# Altium footprint library Reflow3D1411sep.PcbLib: 657 footprints (part 33 of 42)
Each footprint in its own frame and in the unit in brackets; x right, y up, seen from the top. Pads: shape width x height; smd on the part's side, far side on the other; paste and mask are expansions set on the pad; w line width, h text height; cw(c..) or ccw(c..) is an arc to the next point about the centre after c.
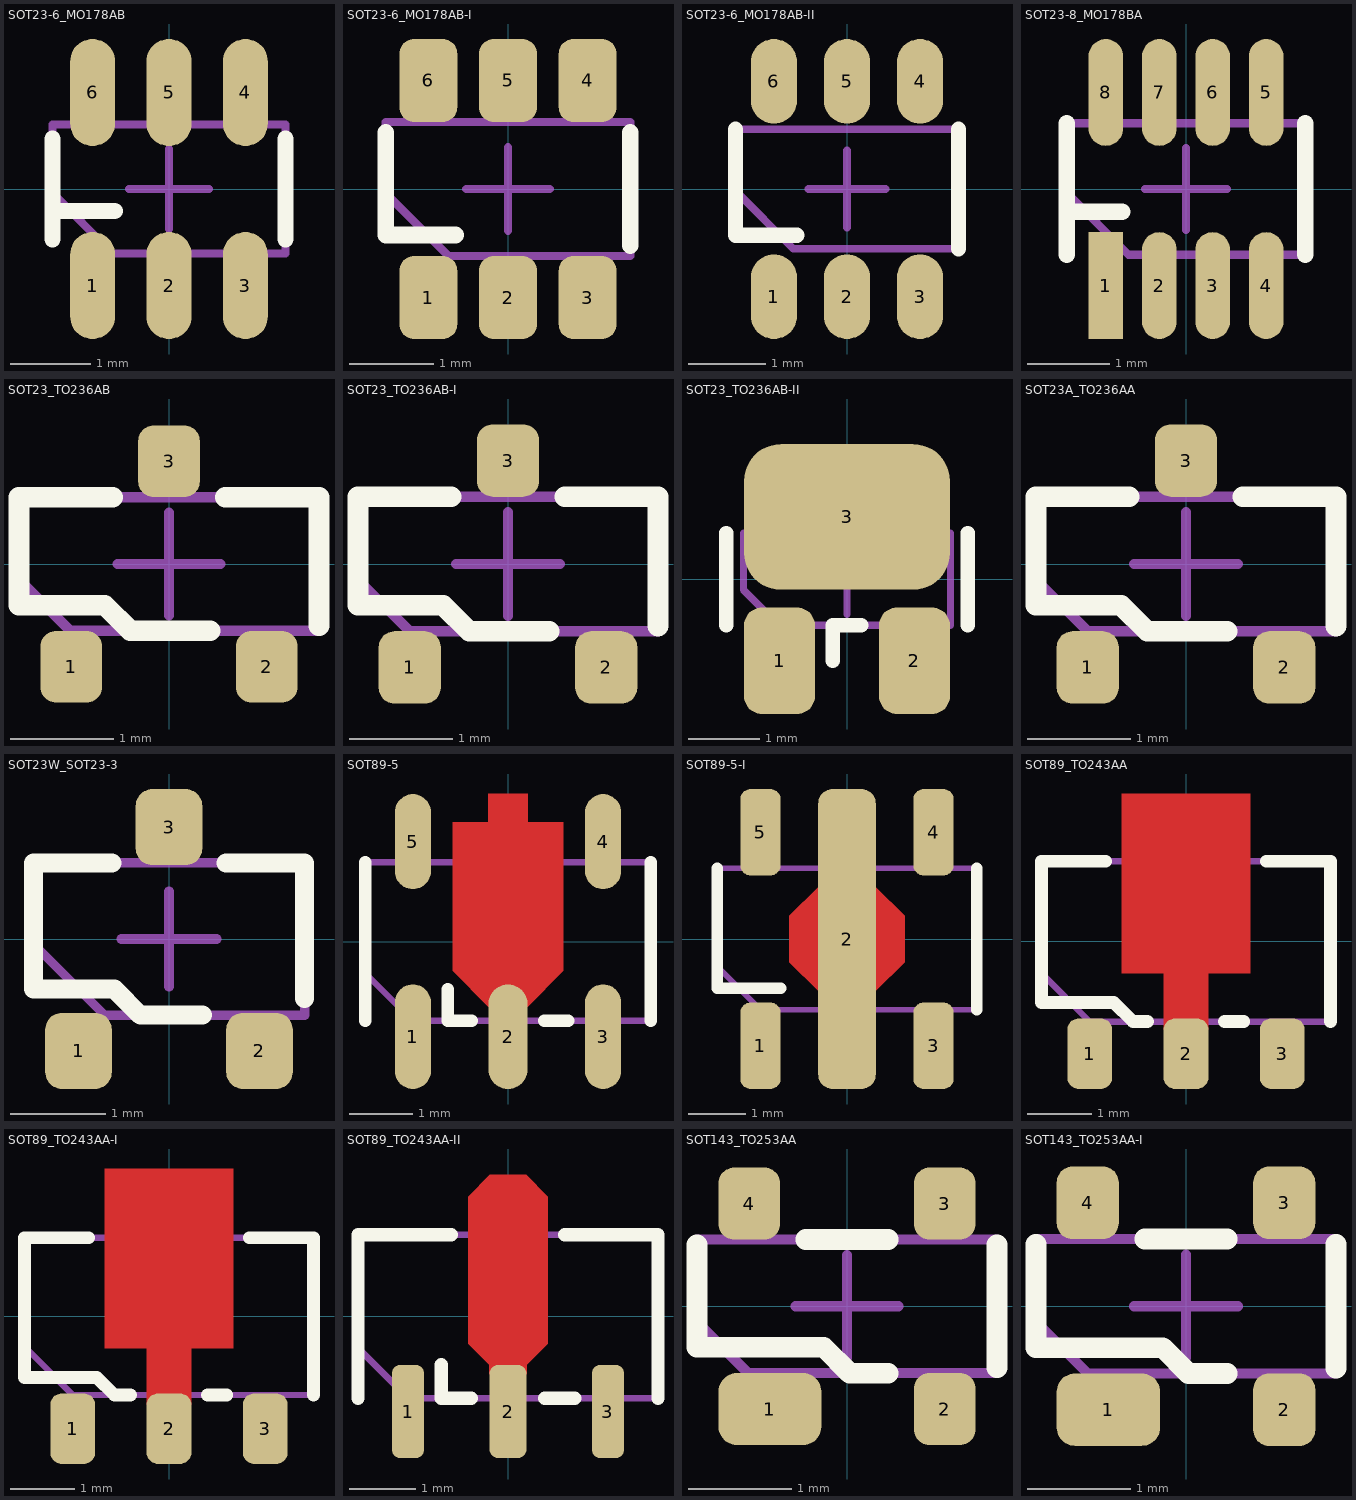
[diagram p32: the footprints below, top view; thin cyan lines are the x and y axes]

## SOT23-6_MO178AB [mm] "www.maxim-ic.com, 21-0058.PDF, 90-0175.PDF; www.jedec.org, Mo-178c.PDF"
height 1.25
pads (6):
  oval 0.56x1.33 smd mask+0.075: 1(-0.95,-1.2) 2(0,-1.2) 3(0.95,-1.2) 4(0.95,1.2) 5(0,1.2) 6(-0.95,1.2)
Top Overlay:
  lines w0.2: -1.45,-0.625 -1.45,0.625 ; -1.45,-0.275 -0.675,-0.275 ; 1.45,-0.625 1.45,0.625
Mechanical 13:
  lines w0.1: -1.45,-0.05 -0.7,-0.8 1.45,-0.8 1.45,0.8 -1.45,0.8 -1.45,-0.05
Mechanical 15:
  lines w0.1: -0.5,0 0.5,0 ; 0,-0.5 0,0.5
3D body: height 1.45, standoff 0, extent -1.5,-0.875 1.5,0.875

## SOT23-6_MO178AB-I [mm] "www.national.com, mf06a.pdf"
height 1.1
pads (6):
  rrect50% 0.69x0.99 smd mask+0.05: 1(-0.95,-1.295) 2(0,-1.295) 3(0.95,-1.295) 4(0.95,1.295) 5(0,1.295) 6(-0.95,1.295)
Top Overlay:
  lines w0.2: -1.46,0.675 -1.46,-0.55 -0.625,-0.55 ; 1.46,-0.675 1.46,0.675
Mechanical 13:
  lines w0.1: -1.46,-0.05 -0.71,-0.8 1.46,-0.8 1.46,0.8 -1.46,0.8 -1.46,-0.05
Mechanical 15:
  lines w0.1: -0.5,0 0.5,0 ; 0,-0.5 0,0.5
3D body: height 1.22, standoff 0, extent -1.495,-0.835 1.495,0.835

## SOT23-6_MO178AB-II [mm] "www.microchip.com, en012702.pdf"
height 1.18
pads (6):
  oval 0.6x1.1 smd mask+0.075: 1(-0.95,-1.4) 2(0,-1.4) 3(0.95,-1.4) 4(0.95,1.4) 5(0,1.4) 6(-0.95,1.4)
Top Overlay:
  lines w0.2: -1.45,0.775 -1.45,-0.6 -0.65,-0.6 ; 1.45,-0.775 1.45,0.775
Mechanical 13:
  lines w0.1: -1.45,-0.025 -0.7,-0.775 1.45,-0.775 1.45,0.775 -1.45,0.775 -1.45,-0.025
Mechanical 15:
  lines w0.1: -0.5,0 0.5,0 ; 0,-0.5 0,0.5
3D body: height 1.45, standoff 0, extent -1.55,-0.9 1.55,0.9

## SOT23-8_MO178BA [mm] "www.maxim-ic.com, 21-0078.PDF, 90-0176.PDF; www.jedec.org, Mo-178c.PDF"
height 1.25
pads (8):
  rect 0.42x1.3 smd mask+0.05: 1(-0.975,-1.175)
  oval 0.42x1.3 smd mask+0.05: 2(-0.325,-1.175) 3(0.325,-1.175) 4(0.975,-1.175) 5(0.975,1.175) 6(0.325,1.175) 7(-0.325,1.175) 8(-0.975,1.175)
Top Overlay:
  lines w0.2: -1.45,-0.8 -1.45,0.8 ; -1.45,-0.275 -0.775,-0.275 ; 1.45,-0.8 1.45,0.8
Mechanical 13:
  lines w0.1: -1.45,-0.05 -0.7,-0.8 1.45,-0.8 1.45,0.8 -1.45,0.8 -1.45,-0.05
Mechanical 15:
  lines w0.1: -0.5,0 0.5,0 ; 0,-0.5 0,0.5
3D body: height 1.45, standoff 0, extent -1.5,-0.875 1.5,0.875

## SOT23_TO236AB [mm] "www.nxp.com, SOT023_fr.pdf; www.maxim-ic.com, 21-0051.PDF; www.jedec.org, to-236h.pdf"
height 1
pads (3):
  rrect50% 0.6x0.7 smd mask+0.075: 1(-0.95,-1) 2(0.95,-1) 3(0,1)
Top Overlay:
  lines w0.2: -0.55,0.65 -1.46,0.65 -1.46,-0.4 -0.625,-0.4 -0.375,-0.65 0.4,-0.65 ; 0.55,0.65 1.46,0.65 1.46,-0.6
Mechanical 13:
  lines w0.1: -1.46,-0.15 -1.46,0.65 1.46,0.65 1.46,-0.65 -0.96,-0.65 -1.46,-0.15
Mechanical 15:
  lines w0.1: -0.5,0 0.5,0 ; 0,-0.5 0,0.5
3D body: height 1.12, standoff 0, extent -1.52,-0.7 1.52,0.7

## SOT23_TO236AB-I [mm] "www.nxp.com, sot023_po.pdf, SOT023_fr.pdf"
height 1
pads (3):
  rrect50% 0.6x0.7 smd mask+0.075: 1(-0.95,-1) 2(0.95,-1) 3(0,1)
Top Overlay:
  lines w0.2: -0.55,0.65 -1.45,0.65 -1.45,-0.4 -0.625,-0.4 -0.375,-0.65 0.4,-0.65 ; 0.55,0.65 1.45,0.65 1.45,-0.6
Mechanical 13:
  lines w0.1: -1.45,-0.15 -0.95,-0.65 1.45,-0.65 1.45,0.65 -1.45,0.65 -1.45,-0.15
Mechanical 15:
  lines w0.1: -0.5,0 0.5,0 ; 0,-0.5 0,0.5
3D body: height 1.1, standoff 0, extent -1.5,-0.7 1.5,0.7

## SOT23_TO236AB-II [mm] "www.vishay.com, 70739.pdf; www.maxim-ic.com, 21-0051.PDF; www.jedec.org, to-236h.pdf"
height 1
pads (3):
  rrect50% 1x1.5 smd mask+0.075: 1(-0.95,-1.15) 2(0.95,-1.15)
  rrect50% 2.9x2.05 smd mask+0.075: 3(0,0.875)
Top Overlay:
  lines w0.2: -1.7,-0.65 -1.7,0.65 ; -0.2,-1.15 -0.2,-0.65 0.2,-0.65 ; 1.7,-0.65 1.7,0.65
Mechanical 13:
  lines w0.1: -1.46,-0.15 -0.96,-0.65 1.46,-0.65 1.46,0.65 -1.46,0.65 -1.46,-0.15
Mechanical 15:
  lines w0.1: -0.5,0 0.5,0 ; 0,-0.5 0,0.5
3D body: height 1.12, standoff 0, extent -1.52,-0.7 1.52,0.7

## SOT23A_TO236AA [mm] "www.nxp.com, SOT023_fr.pdf; www.aosmd.com, AOZ8212CI-05.pdf; www.jedec.org, to-236h.pdf"
height 0.96
pads (3):
  rrect50% 0.6x0.7 smd mask+0.075: 1(-0.95,-1) 2(0.95,-1) 3(0,1)
Top Overlay:
  lines w0.2: -0.55,0.65 -1.45,0.65 -1.45,-0.4 -0.625,-0.4 -0.375,-0.65 0.4,-0.65 ; 0.55,0.65 1.45,0.65 1.45,-0.6
Mechanical 13:
  lines w0.1: -1.45,-0.15 -0.95,-0.65 1.45,-0.65 1.45,0.65 -1.45,0.65 -1.45,-0.15
Mechanical 15:
  lines w0.1: -0.5,0 0.5,0 ; 0,-0.5 0,0.5
3D body: height 1.17, standoff 0, extent -1.52,-0.7 1.52,0.7

## SOT23W_SOT23-3 [mm] "www.nxp.com, SOT023-3.pdf, SOT346_fr.pdf"
height 1.2
pads (3):
  rrect50% 0.7x0.8 smd mask+0.075: 1(-0.95,-1.175) 2(0.95,-1.175) 3(0,1.175)
Top Overlay:
  lines w0.2: -0.6,0.8 -1.425,0.8 -1.425,-0.525 -0.575,-0.525 -0.3,-0.8 0.35,-0.8 ; 0.6,0.8 1.425,0.8 1.425,-0.625
Mechanical 13:
  lines w0.1: -1.425,-0.05 -0.675,-0.8 1.425,-0.8 1.425,0.8 -1.425,0.8 -1.425,-0.05
Mechanical 15:
  lines w0.1: -0.5,0 0.5,0 ; 0,-0.5 0,0.5
3D body: height 1.35, standoff 0, extent -1.5,-0.85 1.5,0.85

## SOT89-5 [mm] "www.onsemi.com, 528AB.PDF"
height 1.5
pads (5):
  oval 0.57x1.65 smd mask+0.075: 1(-1.5,-1.5) 3(1.5,-1.5)
  oval 0.62x1.65 smd paste-25.4 mask+0.075: 2(0,-1.5)
  oval 0.57x1.5 smd mask+0.075: 4(1.5,1.575) 5(-1.5,1.575)
Top Layer:
  region: -0.875,-0.46 -0.31,-1.025 0.31,-1.025 0.875,-0.46 0.875,1.88 0.31,1.88 0.31,2.33 -0.31,2.33 -0.31,1.88 -0.875,1.88
Top Overlay:
  lines w0.2: -2.25,-1.25 -2.25,1.25 ; -0.95,-0.75 -0.95,-1.25 -0.575,-1.25 ; 0.575,-1.25 0.95,-1.25 ; 2.25,-1.25 2.25,1.25
Top Paste:
  region: -0.825,1.83 -0.825,-0.44 -0.26,-1.005 -0.26,-2.275 0.26,-2.275 0.26,-1.005 0.825,-0.44 0.825,1.83 0.26,1.83 0.26,2.28 -0.26,2.28 -0.26,1.83
Top Solder:
  region: 0.95,-0.495 0.95,1.955 0.385,1.955 0.385,2.405 -0.385,2.405 -0.385,1.955 -0.95,1.955 -0.95,-0.495 -0.345,-1.1 0.345,-1.1
Mechanical 13:
  lines w0.1: -2.25,-0.5 -2.25,1.25 2.25,1.25 2.25,-1.25 -1.5,-1.25 -2.25,-0.5
Mechanical 15:
  lines w0.1: -0.5,0 0.5,0 ; 0,-0.5 0,0.5
3D body: height 1.6, standoff 0, extent -2.3,-1.3 2.3,1.3

## SOT89-5-I [mm] "www.microchip.com, en012702.pdf"
height 1.5
pads (5):
  rrect50% 0.7x1.5 smd mask+0.075: 1(-1.5,-1.85) 3(1.5,-1.85) 4(1.5,1.85) 5(-1.5,1.85)
  rrect50% 1x5.2 smd paste-25.4 mask+0.075: 2(0,0)
Top Layer:
  region: -1,-0.4 -0.5,-0.9 0.5,-0.9 1,-0.4 1,0.4 0.5,0.9 -0.5,0.9 -1,0.4
Top Overlay:
  lines w0.2: -2.25,1.225 -2.25,-0.85 -1.15,-0.85 ; 2.25,-1.225 2.25,1.225
Top Paste:
  region: -0.95,0.38 -0.95,-0.38 -0.45,-0.88 -0.45,-2.55 0.45,-2.55 0.45,-0.88 0.95,-0.38 0.95,0.38 0.45,0.88 0.45,2.55 -0.45,2.55 -0.45,0.88
Top Solder:
  region: 1.075,-0.435 1.075,0.435 0.535,0.975 -0.535,0.975 -1.075,0.435 -1.075,-0.435 -0.535,-0.975 0.535,-0.975
Mechanical 13:
  lines w0.1: -2.25,-0.475 -1.5,-1.225 2.25,-1.225 2.25,1.225 -2.25,1.225 -2.25,-0.475
Mechanical 15:
  lines w0.1: -0.5,0 0.5,0 ; 0,-0.5 0,0.5
3D body: height 1.6, standoff 0, extent -2.3,-1.3 2.3,1.3

## SOT89_TO243AA [mm] "www.nxp.com, SOT89.pdf, SOT089_fr.pdf"
height 1.5
pads (3):
  rrect50% 0.7x1.1 smd mask+0.075: 1(-1.5,-1.75) 2(0,-1.75) 3(1.5,-1.75)
Top Layer:
  region: -1,-0.5 -0.35,-0.5 -0.35,-1.375 0.35,-1.375 0.35,-0.5 1,-0.5 1,2.3 -1,2.3
Top Overlay:
  lines w0.2: -1.25,1.25 -2.25,1.25 -2.25,-0.95 -1.125,-0.95 -0.825,-1.25 -0.6,-1.25 ; 0.6,-1.25 0.9,-1.25 ; 1.25,1.25 2.25,1.25 2.25,-1.25
Top Paste:
  region: -0.6,1.2 -0.6,0 0.6,0 0.6,1.2
  region: -0.95,2.25 -0.95,1.4 0.95,1.4 0.95,2.25
Top Solder:
  region: 1.075,-0.575 1.075,2.375 -1.075,2.375 -1.075,-0.575 -0.425,-0.575 -0.425,-1.45 0.425,-1.45 0.425,-0.575
Mechanical 13:
  lines w0.1: -2.25,-0.5 -1.5,-1.25 2.25,-1.25 2.25,1.25 -2.25,1.25 -2.25,-0.5
Mechanical 15:
  lines w0.1: -0.5,0 0.5,0 ; 0,-0.5 0,0.5
3D body: height 1.6, standoff 0, extent -2.3,-1.3 2.3,1.3

## SOT89_TO243AA-I [mm] "www.nxp.com, SOT089_fr.pdf; www.jedec.org, To-243c.pdf"
height 1.5
pads (3):
  rrect50% 0.7x1.1 smd mask+0.075: 1(-1.5,-1.75) 2(0,-1.75) 3(1.5,-1.75)
Top Layer:
  region: -1,-0.5 -0.35,-0.5 -0.35,-1.375 0.35,-1.375 0.35,-0.5 1,-0.5 1,2.3 -1,2.3
Top Overlay:
  lines w0.2: -1.25,1.225 -2.25,1.225 -2.25,-0.95 -1.125,-0.95 -0.85,-1.225 -0.6,-1.225 ; 0.6,-1.225 0.9,-1.225 ; 1.25,1.225 2.25,1.225 2.25,-1.225
Top Paste:
  region: -0.6,1.2 -0.6,0 0.6,0 0.6,1.2
  region: -0.95,2.25 -0.95,1.4 0.95,1.4 0.95,2.25
Top Solder:
  region: 1.075,-0.575 1.075,2.375 -1.075,2.375 -1.075,-0.575 -0.425,-0.575 -0.425,-1.45 0.425,-1.45 0.425,-0.575
Mechanical 13:
  lines w0.1: -2.25,-0.475 -1.5,-1.225 2.25,-1.225 2.25,1.225 -2.25,1.225 -2.25,-0.475
Mechanical 15:
  lines w0.1: -0.5,0 0.5,0 ; 0,-0.5 0,0.5
3D body: height 1.6, standoff 0, extent -2.3,-1.3 2.3,1.3

## SOT89_TO243AA-II [mm] "www.microchip.com, en012702.pdf; www.jedec.org, To-243c.pdf"
height 1.5
pads (3):
  rrect50% 0.48x1.4 smd mask+0.075: 1(-1.5,-1.425) 3(1.5,-1.425)
  rrect50% 0.56x1.4 smd paste-25.4 mask+0.075: 2(0,-1.425)
Top Layer:
  region: -0.6,-0.405 -0.28,-0.725 -0.28,-0.865 0.28,-0.865 0.28,-0.725 0.6,-0.405 0.6,1.8 0.275,2.125 -0.275,2.125 -0.6,1.8
Top Overlay:
  lines w0.2: -2.25,-1.225 -2.25,1.225 -0.85,1.225 ; -1,-0.725 -1,-1.225 -0.55,-1.225 ; 0.55,-1.225 1,-1.225 ; 0.85,1.225 2.25,1.225 2.25,-1.225
Top Paste:
  region: -0.55,1.78 -0.55,-0.385 -0.23,-0.705 -0.23,-2.075 0.23,-2.075 0.23,-0.705 0.55,-0.385 0.55,1.78 0.255,2.075 -0.255,2.075
Top Solder:
  region: 0.675,-0.44 0.675,1.835 0.31,2.2 -0.31,2.2 -0.675,1.835 -0.675,-0.44 -0.355,-0.76 -0.355,-0.94 0.355,-0.94 0.355,-0.76
Mechanical 13:
  lines w0.1: -2.25,-0.475 -2.25,1.225 2.25,1.225 2.25,-1.225 -1.5,-1.225 -2.25,-0.475
Mechanical 15:
  lines w0.1: -0.5,0 0.5,0 ; 0,-0.5 0,0.5
3D body: height 1.6, standoff 0, extent -2.3,-1.3 2.3,1.3

## SOT143_TO253AA [mm] "www.nxp.com, SOT143B_fr.pdf; www.maxim-ic.com, 21-0052.PDF; www.jedec.org, to-253d.pdf"
height 1
pads (4):
  rrect50% 1x0.7 smd mask+0.075: 1(-0.75,-1)
  rrect50% 0.6x0.7 smd mask+0.075: 2(0.95,-1) 3(0.95,1) 4(-0.95,1)
Top Overlay:
  lines w0.2: -1.46,0.6 -1.46,-0.4 -0.225,-0.4 0.025,-0.65 0.4,-0.65 ; -0.4,0.65 0.4,0.65 ; 1.46,-0.6 1.46,0.6
Mechanical 13:
  lines w0.1: -1.46,-0.15 -1.46,0.65 1.46,0.65 1.46,-0.65 -0.96,-0.65 -1.46,-0.15
Mechanical 15:
  lines w0.1: -0.5,0 0.5,0 ; 0,-0.5 0,0.5
3D body: height 1.22, standoff 0, extent -1.52,-0.7 1.52,0.7

## SOT143_TO253AA-I [mm] "www.nxp.com, SOT143B.pdf, SOT143B_fr.pdf"
height 1
pads (4):
  rrect50% 1x0.7 smd mask+0.075: 1(-0.75,-1)
  rrect50% 0.6x0.7 smd mask+0.075: 2(0.95,-1) 3(0.95,1) 4(-0.95,1)
Top Overlay:
  lines w0.2: -1.45,0.6 -1.45,-0.4 -0.225,-0.4 0.025,-0.65 0.4,-0.65 ; -0.4,0.65 0.4,0.65 ; 1.45,-0.6 1.45,0.6
Mechanical 13:
  lines w0.1: -1.45,-0.15 -0.95,-0.65 1.45,-0.65 1.45,0.65 -1.45,0.65 -1.45,-0.15
Mechanical 15:
  lines w0.1: -0.5,0 0.5,0 ; 0,-0.5 0,0.5
3D body: height 1.1, standoff 0, extent -1.5,-0.7 1.5,0.7